# Altium footprint library ACTION标准库.pcblib: 504 footprints (part 24 of 32)
Each footprint in its own frame and in the unit in brackets; x right, y up, seen from the top. Pads: shape width x height; smd on the part's side, far side on the other; paste and mask are expansions set on the pad; w line width, h text height; cw(c..) or ccw(c..) is an arc to the next point about the centre after c.
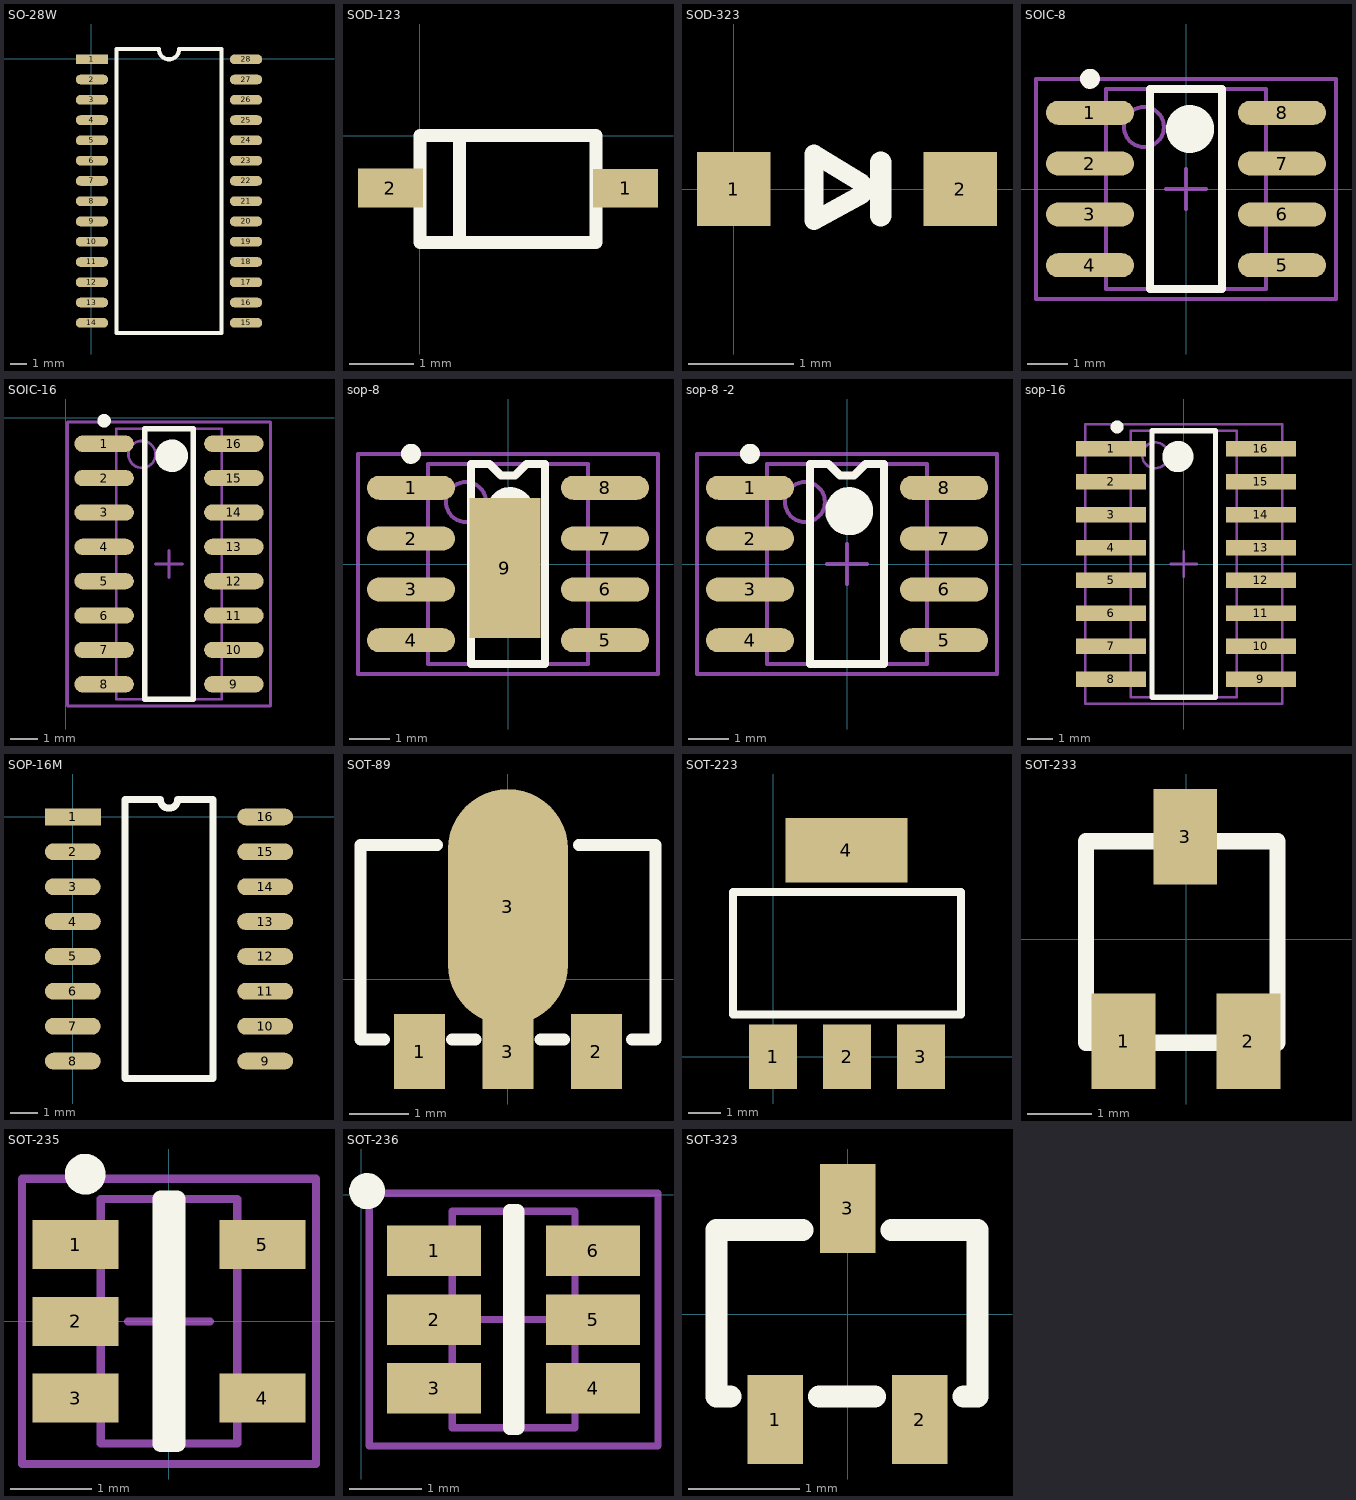
[diagram p23: the footprints below, top view; thin cyan lines are the x and y axes]

## SO-28W [mil]
pads (28):
  rect 80x24 smd: 1(2,-1)
  oval 80x24 smd: 2(2,-51) 3(2,-101) 4(2,-151) 5(2,-201) 6(2,-251) 7(2,-301) 8(2,-351) 9(2,-401) 10(2,-451) 11(2,-501) 12(2,-551) 13(2,-601) 14(2,-651) 15(382,-651) 16(382,-601) 17(382,-551) 18(382,-501) 19(382,-451) 20(382,-401) 21(382,-351) 22(382,-301) 23(382,-251) 24(382,-201) 25(382,-151) 26(382,-101) 27(382,-51) 28(382,-1)
Top Overlay:
  lines w10: 62,-676 62,24 167,24 ccw(c192,24) 217,24 322,24 322,-676 62,-676
3D body "SOIC28.STEP": height 104.33, standoff 0, extent -17.76,-677 387.76,27.72

## SOD-123 [mm]
pads (2):
  rect 1x0.6 smd: 1(3.175,-0.813) 2(-0.457,-0.813)
Top Overlay:
  lines w0.198: 0.61,-1.6 0.61,-0.025 ; 2.7,0 0,0 0,-1.65 2.717,-1.65 2.718,-1.651 2.718,0
3D body "SOD123.STEP": height 1.27, standoff 0, extent -0.427,-1.587 3.273,0.013

## SOD-323 [mm]
pads (2):
  rect 0.7x0.7 smd: 1(0,0) 2(2.15,0)
Top Overlay:
  lines w0.178: 1.221,-0.05 0.762,-0.3 0.762,0.332 1.221,0.05
  lines w0.203: 1.397,-0.254 1.397,0.254
3D body: height 1.5, standoff 0, extent 0,-0.584 2.108,0.559

## SOIC-6 [mm] "SOT23, 6-Leads, Body 1.7x1.7mm (max), Pitch 0.50mm, IPC Medium Density"
height 0.55

## SOIC-8 [mm] "SOIC, 8-Leads, Body 5.0x4.0mm (max), Pitch 1.27mm, IPC Medium Density"
height 1.75
pads (8):
  oval 2.2x0.6 smd: 1(-2.4,1.905) 2(-2.4,0.635) 3(-2.4,-0.635) 4(-2.4,-1.905) 5(2.4,-1.905) 6(2.4,-0.635) 7(2.4,0.635) 8(2.4,1.905)
Top Overlay:
  circle w0.6: c0.1,1.5 r0.3
  circle w0.25: c-2.4,2.755 r0.125
  lines w0.2: -0.9,-2.5 0.9,-2.5 0.9,2.5 -0.9,2.5 -0.9,-2.5
Mechanical 13:
  circle w0.1: c-1.05,1.55 r0.5
  lines w0.1: -2,-2.5 2,-2.5 2,2.5 -2,2.5 -2,-2.5
Mechanical 15:
  lines w0.1: -0.5,0 0.5,0 ; 0,-0.5 0,0.5 ; -3.75,-2.75 3.75,-2.75 3.75,2.75 -3.75,2.75 -3.75,-2.75
3D body "SOIC8.STEP": height 1.6, standoff 0, extent -2.995,-2.535 3.046,2.485

## SOIC-16 [mm] "SOIC, 16-Leads, Body 10.0x3.9mm (max), Pitch 1.27mm, IPC Medium Density"
height 1.5
pads (16):
  oval 2.2x0.6 smd: 1(1.41,-0.965) 2(1.41,-2.235) 3(1.41,-3.505) 4(1.41,-4.775) 5(1.41,-6.045) 6(1.41,-7.315) 7(1.41,-8.585) 8(1.41,-9.855) 9(6.21,-9.855) 10(6.21,-8.585) 11(6.21,-7.315) 12(6.21,-6.045) 13(6.21,-4.775) 14(6.21,-3.505) 15(6.21,-2.235) 16(6.21,-0.965)
Top Overlay:
  circle w0.25: c1.41,-0.115 r0.125
  circle w0.6: c3.91,-1.41 r0.3
  lines w0.2: 2.91,-10.41 2.91,-0.41 4.71,-0.41 4.71,-10.41 2.91,-10.41
Mechanical 13:
  circle w0.1: c2.81,-1.36 r0.5
  lines w0.1: 1.86,-10.41 1.86,-0.41 5.76,-0.41 5.76,-10.41 1.86,-10.41
Mechanical 15:
  lines w0.1: 3.31,-5.41 4.31,-5.41 ; 3.81,-5.91 3.81,-4.91 ; 0.06,-10.66 0.06,-0.16 7.56,-0.16 7.56,-10.66 0.06,-10.66
3D body "SOIC16.STEP": height 1.95, standoff 0, extent 0.757,-10.611 6.813,-0.311

## sop-8 [mm] "SOP, 8-Leads, Body 5.0x4.0mm (max), Pitch 1.27mm, IPC Medium Density"
height 1.75
pads (9):
  oval 2.2x0.6 smd: 1(-2.425,1.905) 2(-2.425,0.635) 3(-2.425,-0.635) 4(-2.425,-1.905) 5(2.425,-1.905) 6(2.425,-0.635) 7(2.425,0.635) 8(2.425,1.905)
  rect 1.778x3.5 smd: 9(-0.076,-0.102)
Top Overlay:
  circle w0.25: c-2.425,2.755 r0.125
  circle w0.6: c0.056,1.321 r0.3
  lines w0.2: -0.925,-2.5 -0.925,2.5 -0.462,2.5 -0.172,2.21 0.172,2.21 0.463,2.5 0.925,2.5 0.925,-2.5 -0.925,-2.5
Mechanical 13:
  circle w0.1: c-1.05,1.55 r0.5
  lines w0.1: -2,-2.5 -2,2.5 2,2.5 2,-2.5 -2,-2.5
Mechanical 15:
  lines w0.1: -0.5,0 0.5,0 ; 0,-0.5 0,0.5 ; -3.75,-2.75 -3.75,2.75 3.75,2.75 3.75,-2.75 -3.75,-2.75
3D body "User Library-sop-8.STEP": height 1.6, standoff 0, extent -2.894,-2.485 3.148,2.535

## sop-8 -2 [mm] "SOP, 8-Leads, Body 5.0x4.0mm (max), Pitch 1.27mm, IPC Medium Density"
height 1.75
pads (8):
  oval 2.2x0.6 smd: 1(-2.425,1.905) 2(-2.425,0.635) 3(-2.425,-0.635) 4(-2.425,-1.905) 5(2.425,-1.905) 6(2.425,-0.635) 7(2.425,0.635) 8(2.425,1.905)
Top Overlay:
  circle w0.6: c0.056,1.321 r0.3
  circle w0.25: c-2.425,2.755 r0.125
  lines w0.2: -0.925,-2.5 0.925,-2.5 0.925,2.5 0.463,2.5 0.172,2.21 -0.172,2.21 -0.462,2.5 -0.925,2.5 -0.925,-2.5
Mechanical 13:
  circle w0.1: c-1.05,1.55 r0.5
  lines w0.1: -2,-2.5 2,-2.5 2,2.5 -2,2.5 -2,-2.5
Mechanical 15:
  lines w0.1: -0.5,0 0.5,0 ; 0,-0.5 0,0.5 ; -3.75,-2.75 3.75,-2.75 3.75,2.75 -3.75,2.75 -3.75,-2.75
3D body "User Library-sop-8.STEP": height 1.6, standoff 0, extent -2.894,-2.485 3.148,2.535

## sop-16 [mm] "SOP, 16-Leads, Body 10.3x4.1mm (max), Pitch 1.27mm, IPC Medium Density"
height 1.8
pads (16):
  rect 2.7x0.6 smd: 1(-2.804,4.445) 2(-2.804,3.175) 3(-2.804,1.905) 4(-2.804,0.635) 5(-2.804,-0.635) 6(-2.804,-1.905) 7(-2.804,-3.175) 8(-2.804,-4.445) 9(2.981,-4.445) 10(2.981,-3.175) 11(2.981,-1.905) 12(2.981,-0.635) 13(2.981,0.635) 14(2.981,1.905) 15(2.981,3.175) 16(2.981,4.445)
Top Overlay:
  circle w0.25: c-2.575,5.295 r0.125
  circle w0.6: c-0.225,4.15 r0.3
  lines w0.2: -1.225,-5.15 -1.225,5.15 1.225,5.15 1.225,-5.15 -1.225,-5.15
Mechanical 13:
  circle w0.1: c-1.1,4.2 r0.5
  lines w0.1: -2.05,-5.15 -2.05,5.15 2.05,5.15 2.05,-5.15 -2.05,-5.15
Mechanical 15:
  lines w0.1: -0.5,0 0.5,0 ; 0,-0.5 0,0.5 ; -3.8,-5.4 -3.8,5.4 3.8,5.4 3.8,-5.4 -3.8,-5.4
3D body "User Library-User Library-TLP291-4(SOP16).STEP": height 2.1, standoff 0, extent -3.195,-5.201 3.805,5.099

## SOP-16M [mil]
pads (16):
  rect 80x24 smd: 1(0,0)
  oval 80x24 smd: 2(0,-50) 3(0,-100) 4(0,-150) 5(0,-200) 6(0,-250) 7(0,-300) 8(0,-350) 9(275.59,-350) 10(275.59,-300) 11(275.59,-250) 12(275.59,-200) 13(275.59,-150) 14(275.59,-100) 15(275.59,-50) 16(275.59,0)
Top Overlay:
  lines w10: 75,-375 200.59,-375 200.59,25 150.3,25 cw(c137.8,25) 125.3,25 75,25 75,-375

## SOT-89 [mil]
pads (4):
  rect 34x50 smd: 1(-59.05,-48.27) 2(59.05,-48.27) 3(0,-48.27)
  oval 80x157.48 smd: 3(0,48.27)
Top Overlay:
  lines w7.87: -82.68,-40.31 -98.42,-40.31 -98.42,89.61 -47.24,89.61 ; 47.24,89.61 98.43,89.61 98.43,-40.31
  lines w8: -37.4,-40.31 -21.65,-40.31 ; 21.65,-40.31 37.4,-40.31 ; 82.68,-40.31 98.43,-40.31
3D body "SOT-89.STEP": height 59.45, standoff 0, extent -87.4,-59.45 89.76,109.84

## SOT-223 [mil]
pads (4):
  rect 59x79 smd: 1(0,0) 2(90.55,0) 3(181.1,0)
  rect 150x79 smd: 4(89.88,253.54)
Top Overlay:
  lines w10: -49.45,52 230.55,52 230.55,202 -49.45,202 -49.45,52
3D body "SOT223.STEP": height 65.04, standoff 0.08, extent -41.95,-11.79 213.96,263.8

## SOT-233 [mm]
pads (3):
  rect 1x1.5 smd: 1(-0.978,-1.6) 2(0.978,-1.6) 3(-0.013,1.6)
Top Overlay:
  lines w0.254: -1.567,-1.626 -1.567,1.533 1.435,1.533 1.435,-1.626 -1.567,-1.626
3D body "SOT-23A.STEP": height 1.2, standoff 0, extent -1.513,-1.29 1.387,1.51

## SOT-235 [mm] "SOT23, 5-Leads, Body 3.0x2.6mm (max), Pitch 0.95mm, IPC Medium Density"
height 1.22
pads (5):
  rect 1.05x0.6 smd: 1(-1.143,0.94) 2(-1.143,0) 3(-1.143,-0.94) 4(1.143,-0.94) 5(1.143,0.94)
Top Overlay:
  circle w0.25: c-1.025,1.8 r0.125
  lines w0.2: -0.1,-1.5 -0.1,1.5 0.1,1.5 0.1,-1.5 -0.1,-1.5
Mechanical 13:
  lines w0.1: -0.835,-1.495 0.835,-1.495 0.835,1.495 -0.835,1.495 -0.835,-1.495
Mechanical 15:
  lines w0.1: -0.5,0 0.5,0 ; 0,-0.5 0,0.5 ; -1.8,-1.745 1.8,-1.745 1.8,1.745 -1.8,1.745 -1.8,-1.745
3D body "SOT-23-5.STEP": height 1.2, standoff 0, extent -1.4,-1.501 1.4,1.399

## SOT-236 [mm]
height 0.6
pads (6):
  rect 1.3x0.7 smd: 1(1.008,-0.777) 2(1.008,-1.727) 3(1.008,-2.677) 4(3.208,-2.677) 5(3.208,-1.727) 6(3.208,-0.777)
Top Overlay:
  circle w0.25: c0.078,0.051 r0.125
  lines w0.2: 2.058,-3.227 2.158,-3.227 2.158,-0.227 2.058,-0.227 2.058,-3.227
Mechanical 13:
  lines w0.1: 1.258,-3.227 1.258,-0.227 2.958,-0.227 2.958,-3.227 1.258,-3.227
Mechanical 15:
  lines w0.1: 1.608,-1.727 2.608,-1.727 ; 2.108,-2.227 2.108,-1.227 ; 0.108,-3.477 0.108,0.023 4.108,0.023 4.108,-3.477 0.108,-3.477
3D body "User Library-sot236.STEP": height 1, standoff 0, extent 0.938,-3.289 3.278,-0.369

## SOT-323 [mm]
pads (3):
  rect 0.5x0.8 smd: 1(-0.65,-0.95) 2(0.65,-0.95) 3(0,0.95)
Top Overlay:
  lines w0.2: -1.055,-0.743 -1.18,-0.743 -1.18,0.757 -0.405,0.757 ; -0.255,-0.743 0.245,-0.743 ; 0.395,0.757 1.17,0.757 1.17,-0.743 1.045,-0.743
3D body "SOT323 (SC70-3)-1.STEP": height 1.1, standoff 0, extent -1.07,-1.162 1.13,1.083